# Altium footprint library Библиотека посадочных мест.PcbLib: 128 footprints (part 5 of 8)
Each footprint in its own frame and in the unit in brackets; x right, y up, seen from the top. Pads: shape width x height; smd on the part's side, far side on the other; paste and mask are expansions set on the pad; w line width, h text height; cw(c..) or ccw(c..) is an arc to the next point about the centre after c.
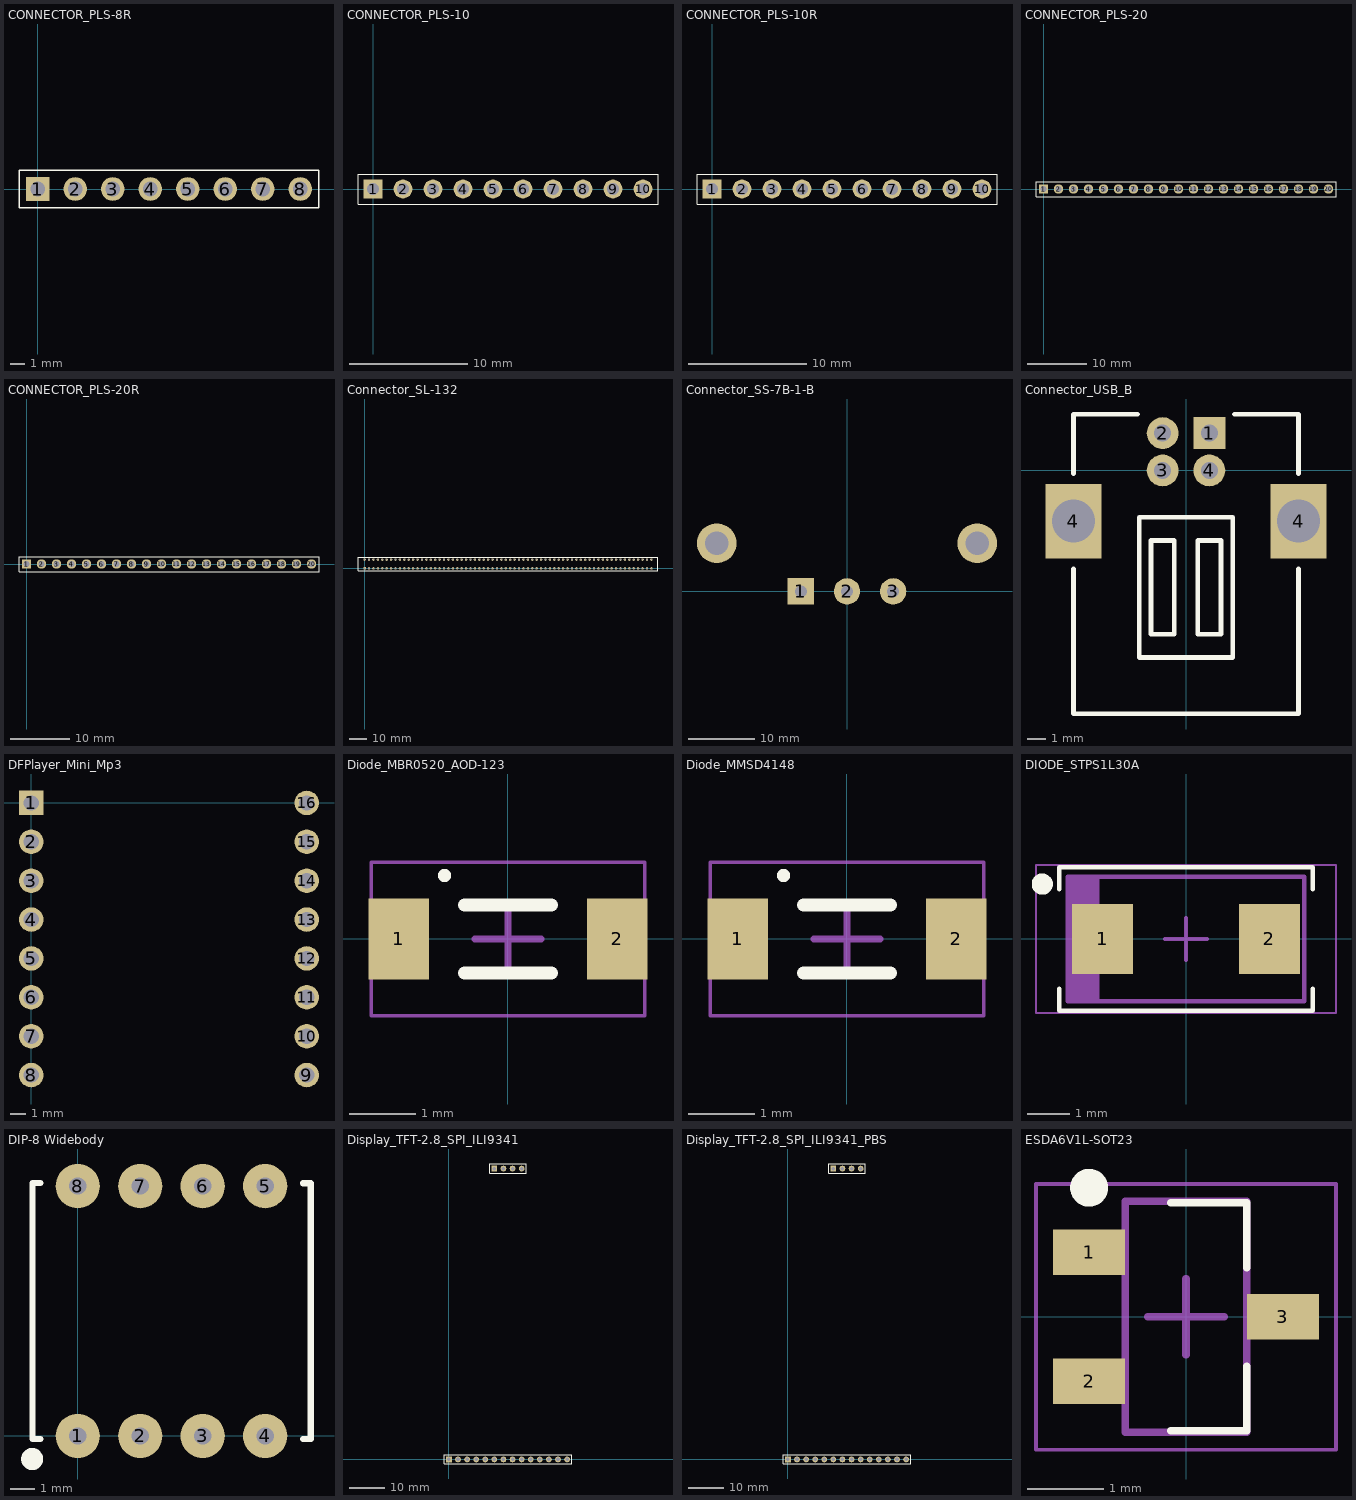
[diagram p4: the footprints below, top view; thin cyan lines are the x and y axes]

## CONNECTOR_PLS-8R [mm]
pads (8):
  rect 1.6x1.6 hole 1: 1(0,0)
  round 1.6 hole 1: 2(2.54,0) 3(5.08,0) 4(7.62,0) 5(10.16,0) 6(12.7,0) 7(15.24,0) 8(17.78,0)
Top Overlay:
  lines w0.1: -1.27,-1.27 3.81,-1.27 8.89,-1.27 13.97,-1.27 19.05,-1.27 19.05,1.27 13.97,1.27 8.89,1.27 3.81,1.27 -1.27,1.27 -1.27,-1.27
3D body "PLS-8R.STEP": height 2.44, standoff -3.05, extent -1.27,-9.9 19.05,0.32

## CONNECTOR_PLS-10 [mm]
pads (10):
  rect 1.6x1.6 hole 1: 1(0,0)
  round 1.6 hole 1: 2(2.54,0) 3(5.08,0) 4(7.62,0) 5(10.16,0) 6(12.7,0) 7(15.24,0) 8(17.78,0) 9(20.32,0) 10(22.86,0)
Top Overlay:
  lines w0.1: -1.27,-1.27 3.81,-1.27 8.89,-1.27 24.13,-1.27 24.13,1.27 8.89,1.27 3.81,1.27 -1.27,1.27 -1.27,-1.27
3D body "PLS-10.STEP": height 8.8, standoff -3, extent -1.27,-1.27 24.13,1.27

## CONNECTOR_PLS-10R [mm]
pads (10):
  rect 1.6x1.6 hole 1: 1(0,0)
  round 1.6 hole 1: 2(2.54,0) 3(5.08,0) 4(7.62,0) 5(10.16,0) 6(12.7,0) 7(15.24,0) 8(17.78,0) 9(20.32,0) 10(22.86,0)
Top Overlay:
  lines w0.1: -1.27,-1.27 3.81,-1.27 8.89,-1.27 24.13,-1.27 24.13,1.27 8.89,1.27 3.81,1.27 -1.27,1.27 -1.27,-1.27
3D body "PLS-10R.STEP": height 2.44, standoff -3.05, extent -1.27,-9.9 24.13,0.32

## CONNECTOR_PLS-20 [mm]
pads (20):
  rect 1.6x1.6 hole 1: 1(0,0)
  round 1.6 hole 1: 2(2.54,0) 3(5.08,0) 4(7.62,0) 5(10.16,0) 6(12.7,0) 7(15.24,0) 8(17.78,0) 9(20.32,0) 10(22.86,0) 11(25.4,0) 12(27.94,0) 13(30.48,0) 14(33.02,0) 15(35.56,0) 16(38.1,0) 17(40.64,0) 18(43.18,0) 19(45.72,0) 20(48.26,0)
Top Overlay:
  lines w0.1: -1.27,-1.27 3.81,-1.27 8.89,-1.27 49.53,-1.27 49.53,1.27 8.89,1.27 3.81,1.27 -1.27,1.27 -1.27,-1.27
3D body "PLS-20.STEP": height 8.8, standoff -3, extent -1.27,-1.27 49.53,1.27

## CONNECTOR_PLS-20R [mm]
pads (20):
  rect 1.6x1.6 hole 1: 1(0,0)
  round 1.6 hole 1: 2(2.54,0) 3(5.08,0) 4(7.62,0) 5(10.16,0) 6(12.7,0) 7(15.24,0) 8(17.78,0) 9(20.32,0) 10(22.86,0) 11(25.4,0) 12(27.94,0) 13(30.48,0) 14(33.02,0) 15(35.56,0) 16(38.1,0) 17(40.64,0) 18(43.18,0) 19(45.72,0) 20(48.26,0)
Top Overlay:
  lines w0.1: -1.27,-1.27 3.81,-1.27 8.89,-1.27 49.53,-1.27 49.53,1.27 8.89,1.27 3.81,1.27 -1.27,1.27 -1.27,-1.27
3D body "PLS-20R.STEP": height 2.44, standoff -3.05, extent -1.27,-9.9 49.53,0.32

## Connector_SL-132 [mm]
pads (132):
  rect 1.4x1.4 hole 0.9: 1(0,0)
  round 1.4 hole 0.9: 2(2.54,0) 3(5.08,0) 4(7.62,0) 5(10.16,0) 6(12.7,0) 7(15.24,0) 8(17.78,0) 9(20.32,0) 10(22.86,0) 11(25.4,0) 12(27.94,0) 13(30.48,0) 14(33.02,0) 15(35.56,0) 16(38.1,0) 17(40.64,0) 18(43.18,0) 19(45.72,0) 20(48.26,0) 21(50.8,0) 22(53.34,0) 23(55.88,0) 24(58.42,0) 25(60.96,0) 26(63.5,0) 27(66.04,0) 28(68.58,0) 29(71.12,0) 30(73.66,0) 31(76.2,0) 32(78.74,0) 33(81.28,0) 34(83.82,0) 35(86.36,0) 36(88.9,0) 37(91.44,0) 38(93.98,0) 39(96.52,0) 40(99.06,0) 41(101.6,0) 42(104.14,0) 43(106.68,0) 44(109.22,0) 45(111.76,0) 46(114.3,0) 47(116.84,0) 48(119.38,0) 49(121.92,0) 50(124.46,0) 51(127,0) 52(129.54,0) 53(132.08,0) 54(134.62,0) 55(137.16,0) 56(139.7,0) 57(142.24,0) 58(144.78,0) 59(147.32,0) 60(149.86,0) 61(152.4,0) 62(154.94,0) 63(157.48,0) 64(160.02,0) 65(162.56,0) 66(0,5.08) 67(2.54,5.08) 68(5.08,5.08) 69(7.62,5.08) 70(10.16,5.08) 71(12.7,5.08) 72(15.24,5.08) 73(17.78,5.08) 74(20.32,5.08) 75(22.86,5.08) 76(25.4,5.08) 77(27.94,5.08) 78(30.48,5.08) 79(33.02,5.08) 80(35.56,5.08) 81(38.1,5.08) 82(40.64,5.08) 83(43.18,5.08) 84(45.72,5.08) 85(48.26,5.08) 86(50.8,5.08) 87(53.34,5.08) 88(55.88,5.08) 89(58.42,5.08) 90(60.96,5.08) 91(63.5,5.08) 92(66.04,5.08) 93(68.58,5.08) 94(71.12,5.08) 95(73.66,5.08) 96(76.2,5.08) 97(78.74,5.08) 98(81.28,5.08) 99(83.82,5.08) 100(86.36,5.08) 101(88.9,5.08) 102(91.44,5.08) 103(93.98,5.08) 104(96.52,5.08) 105(99.06,5.08) 106(101.6,5.08) 107(104.14,5.08) 108(106.68,5.08) 109(109.22,5.08) 110(111.76,5.08) 111(114.3,5.08) 112(116.84,5.08) 113(119.38,5.08) 114(121.92,5.08) 115(124.46,5.08) 116(127,5.08) 117(129.54,5.08) 118(132.08,5.08) 119(134.62,5.08) 120(137.16,5.08) 121(139.7,5.08) 122(142.24,5.08) 123(144.78,5.08) 124(147.32,5.08) 125(149.86,5.08) 126(152.4,5.08) 127(154.94,5.08) 128(157.48,5.08) 129(160.02,5.08) 130(162.56,5.08) 131(165.1,5.08) 132(165.1,0)
Top Overlay:
  lines w0.254: -3.81,-1.27 -3.81,6.35 168.91,6.35 168.91,-1.27 -3.81,-1.27
3D body "SL-132.STEP": height 14.6, standoff -4.85, extent -4.7,-1.96 169.8,7.04

## Connector_SS-7B-1-B [mm]
pads (5):
  rect 4x4 hole 1.8: 1(-7,0)
  round 4 hole 1.8: 2(0,0) 3(7,0)
  round 6 hole 3.5: ""(-19.75,7.3) ""(19.75,7.3)
3D body "SS-7B-1-B.STEP": height 27.6, standoff -3.5, extent -25,-9.9 25,18.8

## Connector_USB_B [mm]
pads (6):
  rect 1.7x1.7 hole 0.92: 1(1.25,2)
  round 1.7 hole 0.92: 2(-1.25,2) 3(-1.25,0) 4(1.25,0)
  rect 3x4 hole 2.3: 4(-6.02,-2.71) 4(6.02,-2.71)
Top Overlay:
  lines w0.254: -6.02,-5.258 -6.02,-13 6.02,-13 6.02,-5.258 ; -6.02,-0.178 -6.02,3 -2.588,3 ; 2.588,3 6.02,3 6.02,-0.178 ; -2.5,-10 2.5,-10 2.5,-2.5 -2.5,-2.5 -2.5,-10 ; -1.875,-8.75 -0.625,-8.75 -0.625,-3.75 -1.875,-3.75 -1.875,-8.75 ; 0.625,-8.75 0.625,-3.75 1.875,-3.75 1.875,-8.75 0.625,-8.75
3D body "USB_B.stp": height 11, standoff -3.65, extent -7.45,-13.071 7.45,3.429

## DFPlayer_Mini_Mp3 [mm] "DFPlayer_Mini_Mp3 (FN-M16P)"
pads (16):
  rect 1.6x1.6 hole 1: 1(0,0)
  round 1.6 hole 1: 2(0,-2.54) 3(0,-5.08) 4(0,-7.62) 5(0,-10.16) 6(0,-12.7) 7(0,-15.24) 8(0,-17.78) 9(18,-17.78) 10(18,-15.24) 11(18,-12.7) 12(18,-10.16) 13(18,-7.62) 14(18,-5.08) 15(18,-2.54) 16(18,0)
3D body "DFPlayer Mini Assem v1.step": height 10, standoff -1.2, extent -1.524,-21.911 19.276,1.549

## Diode_MBR0520_AOD-123 [mm]
height 1.35
pads (2):
  rect 0.91x1.22 smd: 1(-1.64,0) 2(1.64,0)
Top Overlay:
  circle w0.1: c-0.953,0.953 r0.05
  lines w0.2: -0.65,-0.51 0.65,-0.51 ; -0.65,0.51 0.65,0.51
Mechanical 15:
  lines w0.05: -2.05,-1.15 -2.05,1.15 2.05,1.15 2.05,-1.15 -2.05,-1.15
  lines w0.1: -0.5,0 0.5,0 ; 0,-0.5 0,0.5
3D body "SOD-123.step": height 1.35, standoff 0, extent -1.93,-0.902 1.93,0.902

## Diode_MMSD4148 [mm]
height 1.35
pads (2):
  rect 0.91x1.22 smd: 1(-1.64,0) 2(1.64,0)
Top Overlay:
  circle w0.1: c-0.953,0.953 r0.05
  lines w0.2: -0.65,-0.51 0.65,-0.51 ; -0.65,0.51 0.65,0.51
Mechanical 15:
  lines w0.05: -2.05,-1.15 2.05,-1.15 2.05,1.15 -2.05,1.15 -2.05,-1.15
  lines w0.1: -0.5,0 0.5,0 ; 0,-0.5 0,0.5
3D body "SOD-123.step": height 1.35, standoff 0, extent -1.93,-0.902 1.93,0.902

## DIODE_STPS1L30A [mm] "Molded Diode, 2-Leads, Body 5,20x2,60mm, IPC Medium Density DIOM5226X27N"
height 2.7
pads (2):
  rect 1.45x1.65 smd: 1(-1.975,0) 2(1.975,0)
Top Overlay:
  circle w0.25: c-3.4,1.3 r0.125
  lines w0.1: -3,-1.175 -3,-1.7 3,-1.7 3,-1.175 ; -3,1.175 -3,1.7 3,1.7 3,1.175
Mechanical 13:
  rectangle: -2.8,-1.475 -2.047,1.475
  lines w0.1: -2.8,-1.475 -2.8,1.475 2.8,1.475 2.8,-1.475 -2.8,-1.475
Mechanical 15:
  lines w0.05: -3.55,-1.75 -3.55,1.75 3.55,1.75 3.55,-1.75 -3.55,-1.75
  lines w0.1: -0.5,0 0.5,0 ; 0,-0.5 0,0.5
3D body "JEDEC DO-214AC.step": height 2.3, standoff -0.01, extent -2.5,-1.35 2.5,1.35

## DIP-8 Widebody [mm]
pads (8):
  round 1.8 hole 0.7: 1(0,0) 2(2.54,0) 3(5.08,0) 4(7.62,0) 5(7.62,10.16) 6(5.08,10.16) 7(2.54,10.16) 8(0,10.16)
Top Overlay:
  circle w0.5: c-1.854,-0.94 r0.2
  lines w0.254: -1.524,-0.124 -1.84,-0.124 ; -1.524,10.285 -1.84,10.285 -1.84,-0.124 ; 9.158,-0.127 9.474,-0.127 ; 9.158,10.282 9.474,10.282 9.474,-0.127 ; -1.84,-0.124 -1.84,-0.124 ; 9.474,-0.127 9.474,-0.127
3D body "DIP-8 Widebody.step": height 5.2, standoff -2, extent -1.84,-0.125 9.46,10.285

## Display_TFT-2.8_SPI_ILI9341 [mm]
pads (18):
  rect 1.6x1.6 hole 1: 1(0,0) 101(12.7,81.28)
  round 1.6 hole 1: 2(2.54,0) 3(5.08,0) 4(7.62,0) 5(10.16,0) 6(12.7,0) 7(15.24,0) 8(17.78,0) 9(20.32,0) 10(22.86,0) 11(25.4,0) 12(27.94,0) 13(30.48,0) 14(33.02,0) 102(15.24,81.28) 103(17.78,81.28) 104(20.32,81.28)
Top Overlay:
  lines w0.1: -1.27,-1.27 -1.27,1.27 3.81,1.27 8.89,1.27 34.29,1.27 34.29,-1.27 8.89,-1.27 3.81,-1.27 -1.27,-1.27 ; 11.43,80.01 11.43,82.55 21.59,82.55 21.59,80.01 11.43,80.01
3D body "2.8 TFT Module.stp": height 9.34, standoff -2.65, extent -8.566,-2.184 41.624,83.718

## Display_TFT-2.8_SPI_ILI9341_PBS [mm]
pads (18):
  rect 1.6x1.6 hole 1: 1(0,0) 101(12.7,81.28)
  round 1.6 hole 1: 2(2.54,0) 3(5.08,0) 4(7.62,0) 5(10.16,0) 6(12.7,0) 7(15.24,0) 8(17.78,0) 9(20.32,0) 10(22.86,0) 11(25.4,0) 12(27.94,0) 13(30.48,0) 14(33.02,0) 102(15.24,81.28) 103(17.78,81.28) 104(20.32,81.28)
Top Overlay:
  lines w0.1: -1.27,-1.27 3.81,-1.27 8.89,-1.27 34.29,-1.27 34.29,1.27 8.89,1.27 3.81,1.27 -1.27,1.27 -1.27,-1.27 ; 11.43,80.01 21.59,80.01 21.59,82.55 11.43,82.55 11.43,80.01
3D body "2.8 TFT Module.stp": height 15.34, standoff 3.35, extent -8.566,-2.184 41.624,83.718
3D body "User Library-PBS-04.step": height 8.4, standoff -3.2, extent 11.43,80.01 21.59,82.55
3D body "User Library-pbs-14.STEP": height 8.4, standoff -3.2, extent -1.27,-1.27 34.29,1.27

## ESDA6V1L-SOT23 [mm] "SOT23"
height 1.4
pads (3):
  rect 0.95x0.6 smd: 1(-1.275,0.85) 2(-1.275,-0.85) 3(1.275,0)
Top Overlay:
  circle w0.25: c-1.275,1.7 r0.125
  lines w0.1: -0.2,-1.5 0.8,-1.5 0.8,-0.65 ; -0.2,1.5 0.8,1.5 0.8,0.65
Mechanical 13:
  lines w0.1: -0.8,-1.52 0.8,-1.52 0.8,1.52 -0.8,1.52 -0.8,-1.52
Mechanical 15:
  lines w0.05: -1.975,-1.75 1.975,-1.75 1.975,1.75 -1.975,1.75 -1.975,-1.75
  lines w0.1: -0.5,0 0.5,0 ; 0,-0.5 0,0.5
3D body: height 1.4, standoff 0.1, extent -0.8,-1.52 0.8,1.52